# Altium schematic symbol library lib_datalogger.SchLib: 1246 symbols (part 15 of 16) (continued)
## CMP-023-000060-1 (continued)
footprint TERMINAL_BLOCKS_MSTB_8POS
footprint TERMINAL_BLOCKS_MSTB_8POS
pins: 1, 2, 3, 4, 5, 6, 7, 8

## CMP-00024-00000-2
designator U?, comment L298P
Dual Full-Bridge Driver, 4.5 to 7 V, -25 to 130 degC, 20-Pin SOIC, RoHS, Tube; Manufacturer: STMicroelectronics; Max Supply Voltage: 46V; Outputs: 4; Nominal Supply Voltage: 42V; Output Current: 2A; Min Supply Voltage: 4.8V; Max Operating Temperature: 130°C; Package Reference: PowerSO20; Manufacturer URL: http://www.st.com/; Package Quantity: 31; Case/Package: SOIC; Min Operating Temperature: -25°C; Datasheet Version: Jan-00; Pins: 20; Datasheet URL: http://www.st.com/content/ccc/resource/technical/document/datasheet/82/cc/3f/39/0a/29/4d/f0/CD00000240.pdf/files/CD00000240.pdf/jcr:content/translations/en.CD00000240.pdf; Packaging: Rail/Tube; Package Description: 20-Pin Small Outline Integrated Circuits, Body 15.9 x 11 mm, Pitch 1.27 mm; Mounting Technology: SM; RoHS Compliant: True
footprint STM-PowerSO20_N (SOIC, 20-Leads, Body 16x11.1mm, Pitch 1.27mm, Thermal Pad 16x6.2mm, IPC Medium Density)
footprint STM-PowerSO20_L (SOIC, 20-Leads, Body 16x11.1mm, Pitch 1.27mm, Thermal Pad 16x6.2mm, IPC High Density)
footprint STM-PowerSO20_M (SOIC, 20-Leads, Body 16x11.1mm, Pitch 1.27mm, Thermal Pad 16x6.2mm, IPC Low Density)
pins: 1 GND (power) "Ground.", 2 SENSE A (in) "Between this pin and ground is connected the sense resistor to control the current of the load.", 3 NC "Not Connected", 4 OUT 1 (out) "Outputs of the Bridge A; the current that flows through the load connected between these two pins is monitored at pin 1.", 5 OUT 2 (out) "Outputs of the Bridge A; the current that flows through the load connected between these two pins is monitored at pin 1.", 6 VS (power) "Supply Voltage for the Power Output Stages. A non-inductive 100nF capacitor must be connected between this pin and ground.", 7 INPUT 1 (in) "TTL Compatible Inputs of the Bridge A.", 8 ENABLE A (in) "TTL Compatible Enable Input: the L state disables the bridge A (enable A) and/or the bridge B (enable B).", 9 INPUT 2 (in) "TTL Compatible Inputs of the Bridge A.", 10 GND (power) "Ground.", 11 GND (power) "Ground.", 12 VSS (power) "Supply Voltage for the Logic Blocks. A100nF capacitor must be connected between this pin and ground.", 13 INPUT 3 (in) "TTL Compatible Inputs of the Bridge B.", 14 ENABLE B (in) "TTL Compatible Enable Input: the L state disables the bridge A (enable A) and/or the bridge B (enable B).", 15 INPUT 4 (in) "TTL Compatible Inputs of the Bridge B.", 16 OUT 3 (out) "Outputs of the Bridge B. The current that flows through the load connected between these two pins is monitored at pin 15.", 17 OUT 4 (out) "Outputs of the Bridge B. The current that flows through the load connected between these two pins is monitored at pin 15.", 18 NC "Not Connected", 19 SENSE B (in) "Between this pin and ground is connected the sense resistor to control the current of the load.", 20 GND (power) "Ground.", 21 EP "PAD"

## CMP-00024-00001-2
designator U?, comment TB6612FNG,C,8,EL
Driver IC for Dual DC Motor, 2.7 to 5.5 V, 1 A, -20 to 85 degC, 24-Pin SSOP, RoHS, Tape and Reel; Manufacturer: Toshiba; Interface: Parallel; Pins: 24; Manufacturer URL: http://www.toshiba.com/; Packaging: TapeandReel; Package Reference: SSOP-24; Max Operating Temperature: 85°C; RoHS Compliant: True; Min Operating Temperature: -20°C; Package Description: 24-Pin Shrink Small Outline Package Integrated Circuit, Body 7.8 x 5.6 mm, Pitch 0.65 mm; Datasheet URL: https://toshiba.semicon-storage.com/info/docget.jsp?did=10660&prodName=TB6612FNG; Package Quantity: 1; Datasheet Version: Oct-14; Case/Package: SSOP-24; Mounting Technology: SM
footprint TOSH-SSOP-24_M (SOP, 24-Leads, Body 8x5.8mm, Pitch 0.65mm, IPC Low Density)
footprint TOSH-SSOP-24_N (SOP, 24-Leads, Body 8x5.8mm, Pitch 0.65mm, IPC Medium Density)
footprint TOSH-SSOP-24_L (SOP, 24-Leads, Body 8x5.8mm, Pitch 0.65mm, IPC High Density)
pins: 1 AO1 (out) "ch A output 1", 2 AO1 (out) "ch A output 1", 3 PGND1 (power) "Power GND 1", 4 PGND1 (power) "Power GND 1", 5 AO2 (out) "ch A output 2", 6 AO2 (out) "ch A output 2", 7 BO2 (out) "ch B output 2", 8 BO2 (out) "ch B output 2", 9 PGND2 (power) "Power GND 2", 10 PGND2 (power) "Power GND 2", 11 BO1 (out) "ch B output 1", 12 BO1 (out) "ch B output 1", 13 VM2 (power) "Motor supply", 14 VM3 (power) "Motor supply", 15 PWMB (in) "ch B PWM input /200 KOhm pull-down at internal", 16 BIN2 (in) "ch B input 2/200 KOhm pull-down at internal", 17 BIN1 (in) "ch B input 1/200 KOhm pull-down at internal", 18 GND (power) "Small signal GND", 19 STBY (in) ""L" = standby/200 kOhm pull-down at internal", 20 VCC (power) "Small signal supply", 21 AIN1 (in) "ch A input 1/200 KOhm pull-down at internal", 22 AIN2 (in) "ch A input 2/200 KOhm pull-down at internal", 23 PWMA (in) "ch A PWM input /200 KOhm pull-down at internal", 24 VM1 (power) "Motor supply"

## CMP-00024-00002-2
designator U?, comment A4988 Motor Driver
Stepper Motor Driver Carrier, 3 to 5.5 V, 2 A, 16-Pin THD; Manufacturer: Pololu Robotics & Electronics; Datasheet Version: Dec-15; Package Description: 16-Pin Through Hole Device, Body 20.3 x 15.2 mm, Pitch 2.54 mm; Case/Package: A4988MotorDriver; Mounting Technology: TH; RoHS Compliant: Unknown; Datasheet URL: https://www.pololu.com/file/0J1082/a4988-stepper-motor-driver-carrier-dimension-diagram.pdf; Package Reference: A4988 Motor Driver
footprint Polo-A4988 Motor Driver_V (THD, 16-Leads, Body 20.3x15.2mm, Pitch 2.54mm)
pins: 1 ~{EN} (in), 2 MS1 (in), 3 MS2 (in), 4 MS3 (in), 5 ~{RST} (in), 6 ~{SLP} (in), 7 STEP (in), 8 DIR (in), 9 GND (power), 10 VDD (power), 11 1B (power), 12 1A (power), 13 2A (power), 14 2B (power), 15 GND (power), 16 VMOT (power)

## CMP-00024-00003-2
designator U?, comment L293DD
Push-Pull Four Channel Driver with Diodes, 4.5 to 36 V, 20-Pin SOIC, RoHS, Tube; Manufacturer: STMicroelectronics; Outputs: 4; Nominal Supply Voltage: 24V; Nominal Supply Current: 2mA; Output Current: 600mA; Max Supply Voltage: 36V; Min Supply Voltage: 4.5V; Package Reference: SOIC-20; Mounting Technology: SM; Datasheet Version: Jul-03; Manufacturer URL: http://www.st.com/; Pins: 20; Package Quantity: 40; Min Operating Temperature: -40°C; RoHS Compliant: True; Package Description: 20-Pin Small Outline Integrated Circuit, Body 12.8 x 7.5 mm, Pitch 1.27 mm; Case/Package: SOIC; Datasheet URL: http://www.st.com/content/ccc/resource/technical/document/datasheet/04/ac/22/f9/20/5d/43/a1/CD00000059.pdf/files/CD00000059.pdf/jcr:content/translations/en.CD00000059.pdf; Packaging: Rail/Tube; Max Operating Temperature: 150°C
footprint STM-SOIC-20_N (SOIC, 20-Leads, Body 13x7.6mm, Pitch 1.27mm, IPC Medium Density)
footprint STM-SOIC-20_L (SOIC, 20-Leads, Body 13x7.6mm, Pitch 1.27mm, IPC High Density)
footprint STM-SOIC-20_M (SOIC, 20-Leads, Body 13x7.6mm, Pitch 1.27mm, IPC Low Density)
pins: 1 ENABLE1 (in), 2 INPUT1 (in), 3 OUTPUT1 (out), 4 GND (power), 5 GND (power), 6 GND (power), 7 GND (power), 8 OUTPUT2 (out), 9 INPUT2 (in), 10 VS (power), 11 ENABLE2 (in), 12 INPUT3 (in), 13 OUTPUT3 (out), 14 GND (power), 15 GND (power), 16 GND (power), 17 GND (power), 18 OUTPUT4 (out), 19 INPUT4 (in), 20 VSS (power)

## CMP-00024-00004-2
designator U?, comment MAX232CSE+
Multichannel RS-232 Driver/Receiver, 5 V, 0 to 70 degC, 16-Pin SOIC (S16+3), RoHS, Tube; Manufacturer: Maxim; Package Version: Rev. G, 01/2016; Min Supply Voltage: 4.5V; Max Supply Voltage: 5.5V; Receivers: 2; Propagation Delay: 10us; Nominal Supply Current: 10mA; Data Rate: 120Kbps; Nominal Supply Voltage: 5V; Package URL: http://pdfserv.maximintegrated.com/package_dwgs/21-0041.PDF; Min Operating Temperature: 0°C; Datasheet URL: https://datasheets.maximintegrated.com/en/ds/MAX220-MAX249.pdf; Package Quantity: 50; Case/Package: SOIC; Package Description: 16-Pin Small Outline Integrated Circuit, Body 9.9 x 3.9 mm, Pitch 1.27 mm; Package Reference: S16+5; Interface: RS-232; Pins: 16; Manufacturer URL: http://www.maximintegrated.com/; Channels: 2; RoHS Compliant: True; Mounting Technology: SM; Packaging: Rail/Tube; Max Operating Temperature: 70°C; Datasheet Version: Rev. 17, 01/2015
footprint MAXM-S16+5_L (SOIC, 16-Leads, Body 10x4mm, Pitch 1.27mm, IPC High Density)
footprint MAXM-S16+5_M (SOIC, 16-Leads, Body 10x4mm, Pitch 1.27mm, IPC Low Density)
footprint MAXM-S16+5_N (SOIC, 16-Leads, Body 10x4mm, Pitch 1.27mm, IPC Medium Density)
pins: 1 C1+, 2 V+ (power), 3 C1-, 4 C2+, 5 C2-, 6 V- (power), 7 T2OUT (hiz), 8 R2IN (in), 9 R2OUT (hiz), 10 T2IN (in), 11 T1IN (in), 12 R1OUT (hiz), 13 R1IN (in), 14 T1OUT (hiz), 15 GND (power), 16 VCC (power)

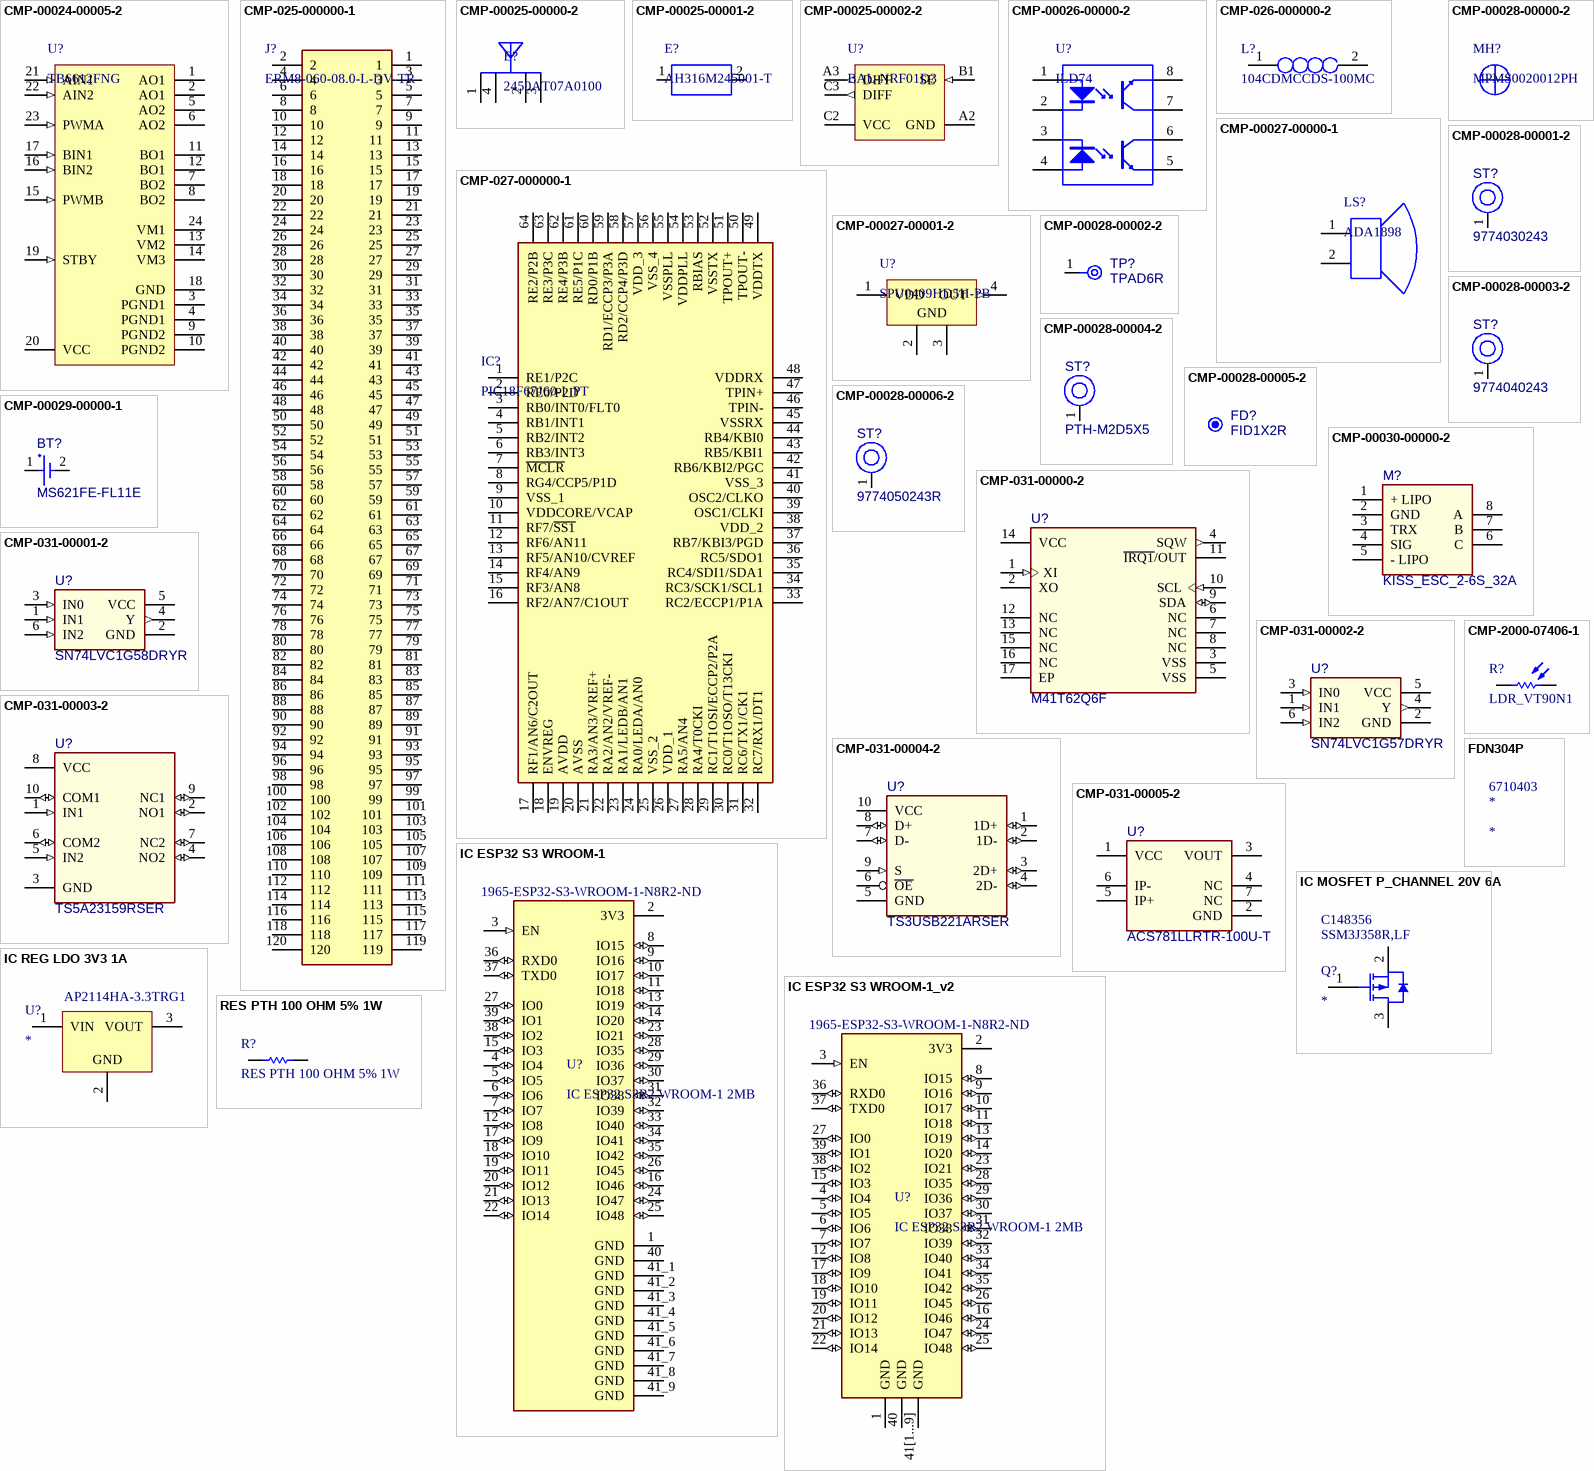
[diagram p43: symbols CMP-00024-00005-2 to RES PTH 100 OHM 5% 1W]

## CMP-00024-00005-2
designator U?, comment TB6612FNG
Driver IC for Dual DC Motor, 15 V, -20 to 85 degC, 24-Pin SSOP, RoHS, Tape and Reel; Manufacturer: Toshiba; Case/Package: SSOP-24; RoHS Compliant: False; Package Description: 24-Pin Shrink Small Outline Package Integrated Circuit, Body 7.8 x 5.6 mm, Pitch 0.65 mm; Package Reference: SSOP-24; Datasheet Version: Oct-14; Mounting Technology: SM; Manufacturer URL: http://www.toshiba.com/; Datasheet URL: https://toshiba.semicon-storage.com/info/docget.jsp?did=10660&prodName=TB6612FNG
footprint TOSH-SSOP-24_M (SOP, 24-Leads, Body 8x5.8mm, Pitch 0.65mm, IPC Low Density)
footprint TOSH-SSOP-24_N (SOP, 24-Leads, Body 8x5.8mm, Pitch 0.65mm, IPC Medium Density)
footprint TOSH-SSOP-24_L (SOP, 24-Leads, Body 8x5.8mm, Pitch 0.65mm, IPC High Density)
pins: 1 AO1 (hiz) "chA output1", 2 AO1 (hiz) "chA output1", 3 PGND1 (power) "Power GND 1", 4 PGND1 (power) "Power GND 1", 5 AO2 (hiz) "chA output2", 6 AO2 (hiz) "chA output2", 7 BO2 (hiz) "chB output2", 8 BO2 (hiz) "chB output2", 9 PGND2 (power) "Power GND 2", 10 PGND2 (power) "Power GND 2", 11 BO1 (hiz) "chB output1", 12 BO1 (hiz) "chB output1", 13 VM2 (power) "Motor supply(2.5V~13.5V)", 14 VM3 (power) "Motor supply(2.5V~13.5V)", 15 PWMB (in) "chB PWM input / 200kohm pull-down at internal", 16 BIN2 (in) "chB input2 / 200kohm pull-down at internal", 17 BIN1 (in) "chB input1 / 200kohm pull-down at internal", 18 GND (power) "Small signal GND", 19 STBY (in) "“L”=standby / 200kohm pull-down at internal", 20 VCC (power) "Small signal supply (2.7V~5.5V)", 21 AIN1 (in) "chA input2 / 200kohm pull-down at internal", 22 AIN2 (in) "chA input1 / 200kohm pull-down at internal", 23 PWMA (in) "chA PWM input / 200kohm pull-down at internal", 24 VM1 (power) "Motor supply(2.5V~13.5V)"

## CMP-025-000000-1
designator J?, comment ERM8-060-08.0-L-DV-TR
Connector; Manufacturer_Name: SAMTEC; Source: SamacSys.SchLib; Datasheet Link: http://suddendocs.samtec.com/prints/erm8-xxx-xx.x-xxx-dv-xxxx-xx-mkt.pdf; Design Item ID: ERM8-060-08.0-L-DV-TR; Arrow Price/Stock: https://www.arrow.com/en/products/erm8-060-08.0-l-dv-tr/samtec; Arrow Part Number: ERM8-060-08.0-L-DV-TR; Manufacturer_Part_Number: ERM8-060-08.0-L-DV-TR
footprint ERM8-060-YY.Y-XXX-DV-TR
footprint ERM8-060-YY.Y-XXX-DV-TR
pins: 1, 2, 3, 4, 5, 6, 7, 8, 9, 10, 11, 12, 13, 14, 15, 16, 17, 18, 19, 20, 21, 22, 23, 24, 25, 26, 27, 28, 29, 30, 31, 32, 33, 34, 35, 36, 37, 38, 39, 40, 41, 42, 43, 44, 45, 46, 47, 48, 49, 50, 51, 52, 53, 54, 55, 56, 57, 58, 59, 60, 61, 62, 63, 64, 65, 66, 67, 68, 69, 70, 71, 72, 73, 74, 75, 76, 77, 78, 79, 80, 81, 82, 83, 84, 85, 86, 87, 88, 89, 90, 91, 92, 93, 94, 95, 96, 97, 98, 99, 100, 101, 102, 103, 104, 105, 106, 107, 108, 109, 110, 111, 112, 113, 114, 115, 116, 117, 118, 119, 120

## CMP-00025-00000-2
designator E?, comment 2450AT07A0100
Ultra-Miniature Chip Antenna, 2.4 GHz, 2 W Max, -40 to 125 degC, 4-Pin SMD, RoHS, Tape and Reel; Manufacturer: Johanson Technology; Datasheet Version: Rev. 3.0 , 02/2016; Datasheet URL: http://www.johansontechnology.com/datasheets/antennas/2450AT07A0100.pdf; Case/Package: 2450AT07A0100; Package Reference: 2450AT07A0100; Package Description: 4-Pin Dual Flat No-lead, Body 1 x 0.5 mm, Pitch 0.6 mm; Mounting Technology: SM; RoHS Compliant: Unknown
footprint JT-2450AT07A0100-4_V (DFN, 4-Leads, Body 1x0.5mm, Pitch 0.60mm)
pins: 1 Feed, 2 GND (power), 3 GND (power), 4 Feed

## CMP-00025-00001-2
designator E?, comment AH316M245001-T
Chip Antenna, 2.4 to 2.5 GHz, -40 to 85 degC, 2-Pin SMD, Pb-Free, Tape and Reel; Manufacturer: Taiyo Yuden; Frequency: 2.45GHz; Impedance: 50Ohm; Manufacturer URL: http://www.t-yuden.com/; Datasheet Version: Sep-15; Min Operating Temperature: -20°C; Mounting Technology: SM; RoHS Compliant: True; Case/Package: AH316M-2; Datasheet URL: http://www.yuden.co.jp/productdata/catalog/en/chipantenna01_e.pdf; Max Operating Temperature: 80°C; Package Quantity: 3000; Pins: 2; Packaging: TapeandReel; Package Description: 2-Pin Surface Mount Device, Body 3.2 x 1.6 mm; Package Reference: AH316M-2
footprint TAYO-AH316M-2_N (Chip, 2-Leads, Body 3.35x1.75mm, IPC Medium Density)
footprint TAYO-AH316M-2_M (Chip, 2-Leads, Body 3.35x1.75mm, IPC Low Density)
footprint TAYO-AH316M-2_L (Chip, 2-Leads, Body 3.35x1.75mm, IPC High Density)
pins: 1, 2

## CMP-00025-00002-2
designator U?, comment BAL-NRF01D3
Conjugate Match Balun to nRF51422-QFAA, nRF24LE1, nRF51822-QFAA/AB, with Integrated Harmonic Filte, 50 Ohm, 2400 to 2540 MHz, -40 to 105 degC, 5-Ball BGA, RoHS, Tape and Reel; Manufacturer: STMicroelectronics; Shielding: Unshielded; Impedance: 50Ohm; Package Reference: Flip-Chip_5B; Min Operating Temperature: -40°C; Datasheet URL: http://www.st.com/st-web-ui/static/active/en/resource/technical/document/datasheet/DM00055606.pdf; Packaging: CutTape; Package Quantity: 1; RoHS Compliant: True; Pins: 5; Max Operating Temperature: 85°C; Manufacturer URL: http://www.st.com/; Datasheet Version: Rev. 6, 07/2015; Case/Package: Flip-Chip_5B; Package Description: 5-Ball Flip Chip, Body 1.5 x 1 mm, Pitch 0.6 mm; Resistance: 50Ohm; Mounting Technology: SM
footprint STM-Flip-Chip_5B_V (BGA, 5-Balls, Body 1.5x1mm)
pins: A2 GND (power), A3 DIFF (out), B1 SE (in), C2 VCC (power), C3 DIFF (out)

## CMP-00026-00000-2
designator U?, comment ILD74
Optocoupler, Phototransistor Output, Dual Channel, 1.3 V, -55 to 100 degC, 8-Pin DIP, RoHS, Tube; Manufacturer: Vishay; Output Voltage: 70V; Power: 400mW; Vce Max: 500mV; Forward Voltage: 1.5V; Package Version: Rev. 1.1, 12/2003; Nominal Vf: 1.3V; Channels: 2; Forward Current: 60mA; Packaging: Rail/Tube; Datasheet Version: Rev. 1.7, 05/2011; Package Reference: DIP8; Package Description: 8-Pin Double In-line Package, Body 9.77 x 6.645 mm, Pitch 2.54 mm; Pins: 16; Mounting Technology: TH; Max Operating Temperature: 100°C; Package URL: http://www.vishay.com/docs/83241/83241.pdf; Datasheet URL: http://www.vishay.com/docs/83640/ild74.pdf; Case/Package: PDIP; Package Quantity: 2000; Manufacturer URL: http://www.vishay.com/; RoHS Compliant: True; Min Operating Temperature: -55°C
footprint VISH-DIP8 (DIP, 8-Leads, Body 9.9x6.8mm, Pitch 2.54mm)
pins: 1 A, 2 C, 3 C, 4 A, 5 E, 6 C, 7 C, 8 E

## CMP-026-000000-2
designator L?, comment 104CDMCCDS-100MC
Fixed Inductors 10uH 20% 30mOhms Metal Composite; Manufacturer_Name: Sumida; Mouser Part Number: 851-104CDMCCDS-100MC; Design Item ID: 104CDMCCDS-100MC; Arrow Price/Stock: https://www.arrow.com/en/products/104cdmccds-100mc/sumida?region=nac; Mouser Price/Stock: https://www.mouser.co.uk/ProductDetail/Sumida/104CDMCCDS-100MC?qs=D3efs7kfDkXYkMvk7UdnpA%3D%3D; Datasheet Link: https://componentsearchengine.com/Datasheets/1/104CDMCCDS-100MC.pdf; Source: SamacSys.SchLib; Manufacturer_Part_Number: 104CDMCCDS-100MC; Arrow Part Number: 104CDMCCDS-100MC; Height: 4mm
footprint 104CDMCCDS100MC
footprint 104CDMCCDS100MC
pins: 1, 2

## CMP-00027-00000-1
designator LS?, comment ADA1898
Mini Speaker, 8 Ohm, 0.2 Wmax, -10 to 40 degC, 2-Pin THD, RoHS; Manufacturer: Adafruit Industries; Mounting Technology: TH; Datasheet URL: https://cdn-shop.adafruit.com/datasheets/P1898.pdf; Package Description: 2-Pin Through Hole Device, Dia 29.3 mm, Pitch 15 mm; Case/Package: ADA1898; Package Reference: ADA1898; Datasheet Version: Mar-14; Manufacturer URL: https://www.adafruit.com/; RoHS Compliant: Unknown
footprint ADAI-ADA1898 (THD, 2-Leads, Dia 29.3mm, Pitch 15mm)
pins: 1 +, 2 -

## CMP-027-000000-1
designator IC?, comment PIC18F67J60-I_PT
Integrated Circuit; Manufacturer_Name: Microchip; Manufacturer_Part_Number: PIC18F67J60-I/PT; Mouser Part Number: 579-PIC18F67J60-I/PT; Arrow Price/Stock: https://www.arrow.com/en/products/pic18f67j60-ipt/microchip-technology; Arrow Part Number: PIC18F67J60-I/PT; Design Item ID: PIC18F67J60-I_PT; Height: 1.2mm; Mouser Price/Stock: https://www.mouser.co.uk/ProductDetail/Microchip-Technology/PIC18F67J60-I-PT?qs=V%2FyyTCAHA4A467aM3zptoA%3D%3D; Datasheet Link: https://datasheet.datasheetarchive.com/originals/distributors/Datasheets-DGA25/1725842.pdf; Source: SamacSys.SchLib
footprint QFP50P1200X1200X120-64N
footprint QFP50P1200X1200X120-64N
pins: 1 RE1/P2C, 2 RE0/P2D, 3 RB0/INT0/FLT0, 4 RB1/INT1, 5 RB2/INT2, 6 RB3/INT3, 7 ~{MCLR}, 8 RG4/CCP5/P1D, 9 VSS_1, 10 VDDCORE/VCAP, 11 RF7/~{SS1}, 12 RF6/AN11, 13 RF5/AN10/CVREF, 14 RF4/AN9, 15 RF3/AN8, 16 RF2/AN7/C1OUT, 17 RF1/AN6/C2OUT, 18 ENVREG, 19 AVDD, 20 AVSS, 21 RA3/AN3/VREF+, 22 RA2/AN2/VREF-, 23 RA1/LEDB/AN1, 24 RA0/LEDA/AN0, 25 VSS_2, 26 VDD_1, 27 RA5/AN4, 28 RA4/T0CKI, 29 RC1/T1OSI/ECCP2/P2A, 30 RC0/T1OSO/T13CKI, 31 RC6/TX1/CK1, 32 RC7/RX1/DT1, 33 RC2/ECCP1/P1A, 34 RC3/SCK1/SCL1, 35 RC4/SDI1/SDA1, 36 RC5/SDO1, 37 RB7/KBI3/PGD, 38 VDD_2, 39 OSC1/CLKI, 40 OSC2/CLKO, 41 VSS_3, 42 RB6/KBI2/PGC, 43 RB5/KBI1, 44 RB4/KBI0, 45 VSSRX, 46 TPIN-, 47 TPIN+, 48 VDDRX, 49 VDDTX, 50 TPOUT-, 51 TPOUT+, 52 VSSTX, 53 RBIAS, 54 VDDPLL, 55 VSSPLL, 56 VSS_4, 57 VDD_3, 58 RD2/CCP4/P3D, 59 RD1/ECCP3/P3A, 60 RD0/P1B, 61 RE5/P1C, 62 RE4/P3B, 63 RE3/P3C, 64 RE2/P2B

## CMP-00027-00001-2
designator U?, comment SPU0409HD5H-PB
SiSonic(TM) Microphone, 1.5 to 3.6 V, -40 to 100 degC, 4-Pin SMD, RoHS, Tape and Reel; Manufacturer: Knowles Acoustics; Voltage Rating: 3.6V; Impedance: 100Ohm; Package Reference: SPU0409HD5H-PB; Mounting Technology: SM; Case/Package: SPU0409HD5H-PB; Package Description: 4-Pin Surface Mount Device, Body 3.76 x 2.95 mm; Datasheet URL: http://datasheet.octopart.com/SPU0409HD5H-PB-Knowles-Acoustics-datasheet-17019172.pdf; Packaging: TapeandReel; Package Quantity: 1200; RoHS Compliant: True; Datasheet Version: Rev. F, 03/2013; Manufacturer URL: http://www.knowles.com/
footprint KNOW-SPU0409HD5H-PB_V (SMD, 4-Leads, Body 3.76x2.95mm)
pins: 1 VDD (power), 2 GROUND (power), 3 GROUND (power), 4 OUT (out)
text: GND

## CMP-00028-00000-2
designator MH?, comment MPMS0020012PH
Copper Pillar, M2 Screw; Manufacturer: B&F Fastener Supply; Drive Type: Phillips; Screw Head Type: PanHead; Mounting Technology: TH; Datasheet URL: https://datasheet.ciiva.com/1034/metd7985a-1034196.pdf; Thread Size: M2; Case/Package: MPMS0020012PH; Package Reference: MPMS0020012PH; Datasheet Version: 42095; Pins: 1; Package Description: 1-Pin Surface Mount Device, Diameter 3.7 mm; Type: MachineScrew; Manufacturer URL: http://www.bffastenersupply.com/; RoHS Compliant: False
footprint BF-MPMS0020012PH (Copper Pillar 9mm, M2 Screw)
pins: 1

## CMP-00028-00001-2
designator ST?, comment 9774030243
WA-SMSI SMT Steel Spacer, M2 Thread Internal, Tin, RoHS, Tape and Reel; Pins: 1
footprint WE-9774030243_V (Round Standoff M2 Steel Spacer)
footprint WE-9774030243_V (Round Standoff M2 Steel Spacer)
pins: 1 H1

## CMP-00028-00002-2
designator TP?, comment TPAD6R  (no BOM)
0.6mm round; Pins: 1
footprint TP06R (Testpoint, round, d=0.6mm)
footprint TP06R (Testpoint, round, d=0.6mm)
pins: 1 TP

## CMP-00028-00003-2
designator ST?, comment 9774040243
WA-SMSI SMT Steel Spacer, M2 Thread Internal, Tin, RoHS, Tape and Reel; Pins: 1
footprint WE-9774030243_V (Round Standoff M2 Steel Spacer)
footprint WE-9774040243_V (Round Standoff M2 Steel Spacer)
pins: 1 H1

## CMP-00028-00004-2
designator ST?, comment PTH-M2D5X5
M2 PTH (2.5mm), 5mm pad; Pins: 1
footprint WE-9774030243_V (Round Standoff M2 Steel Spacer)
footprint PTH-M2D5X5
pins: 1 H1

## CMP-00028-00005-2
designator FD?, comment FID1X2R  (no BOM)
Fiducial - Round 1x2mm; Pins: 0
footprint FID1X2R (Fiducial - Round 1x2mm)
footprint FID1X2R (Fiducial - Round 1x2mm)

## CMP-00028-00006-2
designator ST?, comment 9774050243R
WA-SMSI SMT Steel Spacer, M2 Thread Internal, Tin, RoHS, Tape and Reel; Pins: 1
footprint WE-9774030243_V (Round Standoff M2 Steel Spacer)
footprint WE-9774050243R_V (Round Standoff M2 Steel Spacer)
pins: 1 H1

## CMP-00029-00000-1
designator BT?, comment MS621FE-FL11E
MS Lihium Rechargeable Battery, 3 V, -20 to 60 degC, Tray; RoHS Compliant: NotApplicable; Mounting Technology: WithLeads; Pins: 2
footprint SEIK-MS621FE-FL11E-2_V (SMD, 2-Leads, Diameter 6.8mm)
footprint SEIK-MS621FE-FL11E-2_V (SMD, 2-Leads, Diameter 6.8mm)
pins: 1 +, 2 -

## CMP-00030-00000-2
designator M?, comment KISS_ESC_2-6S_32A
KISS ESC 2-6S 32A (45A limit) - 32bit brushless Motor Ctrl; Pins: 8
footprint ESC 2-6S 32A-Footprint-1
footprint ESC 2-6S 32A-Footprint-1
pins: 1 + LIPO, 2 GND, 3 TRX, 4 SIG, 5 - LIPO, 6 C, 7 B, 8 A

## CMP-031-00000-2
designator U?, comment M41T62Q6F
Low-Power Serial Real-Time Clock (RTC) with Alarm, 1.3 to 4.4 V, -40 to 85 degC, 16-Pin QFN, RoHS, Tape and Reel; Max Supply Voltage: 4.4V; Min Supply Voltage: 1.3V; Case/Package: QFN; Pins: 17; Max Operating Temperature: 85°C; Mounting Technology: SurfaceMount; Min Operating Temperature: -40°C
footprint STM-QFN-16_V (QFN, 16-Leads, Body 3x3mm, Pitch 0.5mm, Thermal Pad 1.8x1.8mm)
footprint STM-QFN-16_V (QFN, 16-Leads, Body 3x3mm, Pitch 0.5mm, Thermal Pad 1.8x1.8mm)
pins: 1 XI (in) "32 KHz oscillator input", 2 XO "32 KHz oscillator output", 3 VSS (power), 4 SQW (out) "32 KHz programmable square wave output", 5 VSS (power) "Battery supply voltage (tie VBAT to VSS if no battery is connected.)", 6 NC "Ground", 7 NC, 8 NC, 9 SDA (io) "Serial data input/output", 10 SCL (in) "Serial clock input", 11 ~{IRQ1}/OUT (oc) "Interrupt 1/output driver/frequency test output (open drain)", 12 NC, 13 NC, 14 VCC (power) "Supply voltage", 15 NC, 16 NC, 17 EP

## CMP-031-00001-2
designator U?, comment SN74LVC1G58DRYR
CONFIGURABLE MULTIPLE-FUNCTION GATE, DRY0006A, LARGE T&R; Pins: 6
footprint DRY0006A_V (SON, 6-Leads, Body 1.45x1mm, Pitch 0.5mm)
footprint DRY0006A_V (SON, 6-Leads, Body 1.45x1mm, Pitch 0.5mm)
pins: 1 IN1 (in), 2 GND (power), 3 IN0 (in), 4 Y (out), 5 VCC (power), 6 IN2 (in)

## CMP-031-00002-2
designator U?, comment SN74LVC1G57DRYR
CONFIGURABLE MULTIPLE-FUNCTION GATE, DRY0006A, LARGE T&R; Pins: 6
footprint DRY0006A_V (SON, 6-Leads, Body 1.45x1mm, Pitch 0.5mm)
footprint DRY0006A_V (SON, 6-Leads, Body 1.45x1mm, Pitch 0.5mm)
pins: 1 IN1 (in), 2 GND (power), 3 IN0 (in), 4 Y (out), 5 VCC (power), 6 IN2 (in)

## CMP-031-00003-2
designator U?, comment TS5A23159RSER
IC SWITCH DUAL SPDT 10UQFN; Min Supply Voltage: 1.65V; Max Supply Voltage: 5.5V; Max Operating Temperature: 85°C; Pins: 10; Min Operating Temperature: -40°C; Case/Package: QFN
footprint RSE0010A_V (QFN, 10-Leads, Body 1.5x2mm, Pitch 0.5mm, TI Recommended)
footprint RSE0010A_V (QFN, 10-Leads, Body 1.5x2mm, Pitch 0.5mm, TI Recommended)
pins: 1 IN1 (in), 2 NO1 (io), 3 GND (power), 4 NO2 (io), 5 IN2 (in), 6 COM2 (io), 7 NC2 (io), 8 VCC (power), 9 NC1 (io), 10 COM1 (io)

## CMP-031-00004-2
designator U?, comment TS3USB221ARSER
ESD Protected, High-Speed USB 2.0 (480 Mbps) 1:2 Multiplexer / Demultiplexer Switch, 6 ohm RON, 2.5 to 3.3V, -40 to 85 degC, 10-Pin UQFN (RSE), Green (RoHS & no Sb/Br); Min Supply Voltage: 2.3V; Max Supply Voltage: 3.6V; Min Operating Temperature: -40°C; Mounting Technology: Surface Mount; Case/Package: QFN; Max Operating Temperature: 85°C; Pins: 10
footprint RSE0010A_V (QFN, 10-Leads, Body 1.5x2mm, Pitch 0.5mm, TI Recommended)
footprint RSE0010A_V (QFN, 10-Leads, Body 1.5x2mm, Pitch 0.5mm, TI Recommended)
pins: 1 1D+ (io) "Bus B", 2 1D- (io) "Bus B", 3 2D+ (io) "Bus B", 4 2D- (io) "Bus B", 5 GND (power) "Ground", 6 ~{OE} "Bus-switch enable", 7 D- (io) "Bus A", 8 D+ (io) "Bus A", 9 S (in) "Select input", 10 VCC (power) "Power supply"

## CMP-031-00005-2
designator U?, comment ACS781LLRTR-100U-T
High-Precision Linear Hall-Effect-Based Current Sensor IC with 200 u? Current Conductor, 3 to 3.6 V, -40 to 150 degC, 7-Pin PSOF, RoHS, Tape and Reel; Pins: 7
footprint ALEG-PSOF-7_V (SOF, 8-Leads, Body 4.8x6.4mm)
footprint ALEG-PSOF-7_V (SOF, 8-Leads, Body 4.8x6.4mm)
pins: 1 VCC (power) "Device power supply terminal", 2 GND (power) "Signal ground terminal", 3 VOUT (power) "Analog output signal", 4 NC "No connection", 5 IP+ "Terminal for current being sampled", 6 IP- "Terminal for current being sampled", 7 NC "No connection"

## CMP-2000-07406-1
designator R?, comment LDR_VT90N1
Photoconductive Resistor, 200 kOhm, 100 V, 80 mW, -40 to 75 degC, 2-Pin THD, RoHS; Manufacturer: Excelitas Technology; SVHC: Cadmiumchloride(15-Jun-2015); Power Rating: 80mW; Resistance @ Lux: 12kohm; Voltage Rating: 100V; Product Range: -; Datasheet Version: 09/2006; Resistor Case Style: -; Operating Temperature Max: 75°C; Package Reference: VT90N1; Datasheet URL: http://datasheet.octopart.com/VT90N1-Excelitas-datasheet-10388451.pdf; Mounting Technology: ThroughHole; Operating Temperature Min: -40°C; Dark Resistance: 200kohm; Package Description: 2-Pin Through Hole Device, Body Width 4.17 mm (Max), Height 2.29 mm; Manufacturer URL: http://www.excelitas.com/Pages/Index.aspx; Packaging: Each
footprint EXCE-VT90N1 (THD, 2-Leads, Body Width 4.17mm (Max), Height 2.29mm)
pins: 1, 2

## FDN304P
designator *  Supplier Part Number 1: 6710403
MOSFET P-CH 20V 2.4A SSOT3; Manufacturer: ON Semiconductor / Fairchild; Manufacturer Part Number: FDN304P; Rds On Max: 52mR; Input Capacitance: 1.312nF; Max Power Dissipation: 500mW; Number of Elements: 1; Turn-Off Delay Time: 40ns; Threshold Voltage: -800mV; Turn-On Delay Time: 15ns; Element Configuration: Single; Gate to Source Voltage (Vgs): 8V; Drain to Source Breakdown Voltage: -20V; Current Rating: -2.4A; Polarity: P-CHANNEL; Supplier 1: RSComponents; RoHS: Yes; Category: MOSFETs; Stock 1: 1; Pricing 1: 5=0,55900, 50=0,52700, 100=0,44900, 250=0,42000, 500=0,39000 (USD); Mount: Surface Mount; Case/Package: SOT-23; Number of Pins: 3; Contact Plating: Tin,Matte; Weight: 0.03g; Min Operating Temperature: -55°C; Max Operating Temperature: 150°C; Package Quantity: 1; Packaging: Tape and Reel; Drain to Source Voltage (Vdss): 20V; Continuous Drain Current (ID): 2.4A; Drain to Source Resistance: 52mR; Power Dissipation: 500mW; On-State Resistance: 52MR; Rise Time: 15ns; Fall Time: 15ns; Nominal Vgs: -800mV; Dual Supply Voltage: -20V; Voltage Rating (DC): -20V; Series: PowerTrench®; Drain-source On Resistance-Max: 52MR; Termination: SMD/SMT; Length: 2.92mm; Width: 3.05mm; Height: 0.94mm; Radiation Hardening: No; REACH SVHC: No SVHC; Lead Free: Lead Free; RoHS Compliant: Yes; ComponentLink1URL: https://datasheet.ciiva.com/6037/fdn304p-6037280.pdf?src-supplier=Farnell; ComponentLink1Description: https://datasheet.ciiva.com/6037/fdn304p-6037280.pdf?src-supplier=Farnell; ComponentLink2URL: https://datasheet.ciiva.com/4442/fdn304p-103941-4442508.pdf?src-supplier=Mouser; ComponentLink2Description: https://datasheet.ciiva.com/4442/fdn304p-103941-4442508.pdf?src-supplier=Mouser; ComponentLink3URL: https://datasheet.ciiva.com/15137/getdatasheetpartid-44333-15137136.pdf?src-supplier=Verical; ComponentLink3Description: https://datasheet.ciiva.com/15137/getdatasheetpartid-44333-15137136.pdf?src-supplier=Verical; ComponentLink4URL: https://datasheet.ciiva.com/26789/fdn304p-26789437.pdf?src-supplier=IIIC; ComponentLink4Description: https://datasheet.ciiva.com/26789/fdn304p-26789437.pdf?src-supplier=IIIC; ComponentLink5URL: https://datasheet.ciiva.com/46618/238539-46618847.pdf?src-supplier=Newark; ComponentLink5Description: https://datasheet.ciiva.com/46618/238539-46618847.pdf?src-supplier=Newark; ComponentLink6URL: https://datasheet.ciiva.com/6037/fdn304p-6037275.pdf?src-supplier=Farnell; ComponentLink6Description: https://datasheet.ciiva.com/6037/fdn304p-6037275.pdf?src-supplier=Farnell; ComponentLink7URL: https://datasheet.ciiva.com/7968/fdn304p-7968108.pdf?src-supplier=Element14; ComponentLink7Description: https://datasheet.ciiva.com/7968/fdn304p-7968108.pdf?src-supplier=Element14; ComponentLink8URL: https://datasheet.ciiva.com/14092/fdn304p-eng-tds-14092054.pdf?src-supplier=Distrelec; ComponentLink8Description: https://datasheet.ciiva.com/14092/fdn304p-eng-tds-14092054.pdf?src-supplier=Distrelec; ComponentLink9URL: https://datasheet.ciiva.com/22712/238539-22712442.pdf?src-supplier=Element14; ComponentLink9Description: https://datasheet.ciiva.com/22712/238539-22712442.pdf?src-supplier=Element14; ComponentLink10URL: https://datasheet.ciiva.com/7968/238539-7968110.pdf?src-supplier=Element14; ComponentLink10Description: https://datasheet.ciiva.com/7968/238539-7968110.pdf?src-supplier=Element14; ComponentLink11URL: https://datasheet.ciiva.com/7968/238539-7968107.pdf?src-supplier=Element14; ComponentLink11Description: https://datasheet.ciiva.com/7968/238539-7968107.pdf?src-supplier=Element14; ComponentLink12URL: https://datasheet.ciiva.com/16772/fdn304p-16772972.pdf?src-supplier=Future+Electronics; ComponentLink12Description: https://datasheet.ciiva.com/16772/fdn304p-16772972.pdf?src-supplier=Future+Electronics; ComponentLink13URL: https://datasheet.ciiva.com/6371/fdn304p-6371069.pdf?src-supplier=Digi-Key; ComponentLink13Description: https://datasheet.ciiva.com/6371/fdn304p-6371069.pdf?src-supplier=Digi-Key